# Altium schematic symbol library Minh_Lib.SchLib: 619 symbols (part 3 of 4) (continued)
## EEE-1HA330UP (continued)
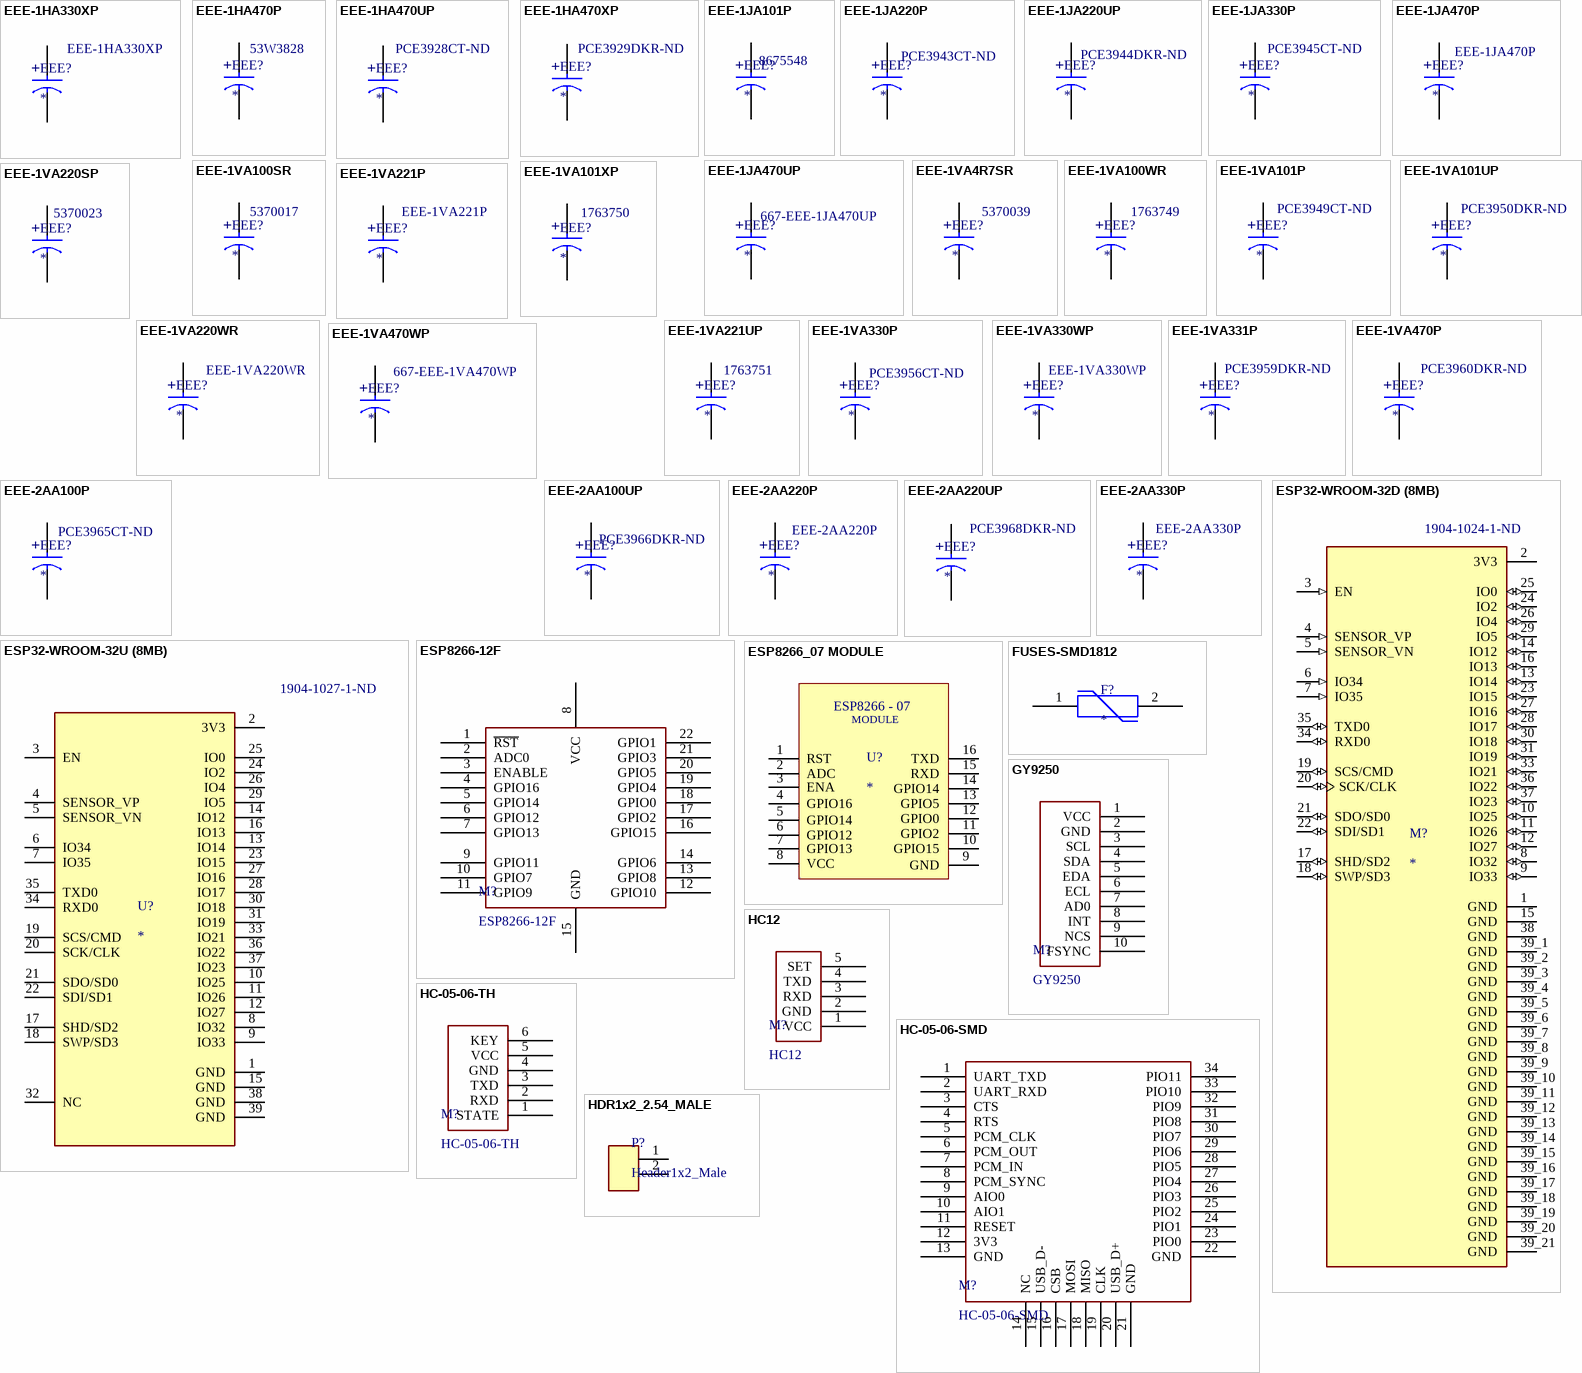
[diagram p9: symbols EEE-1HA330XP to HDR1x2_2.54_MALE]
text: +

## EEE-1HA330XP
designator EEE?  Supplier Part Number 1: EEE-1HA330XP
Cap Aluminum 33uF 50V 20% (6.3 X 7.7mm) SMD 85mA 2000 hr 85°C T/R; Manufacturer: Panasonic; Polarity: Polar; Life (Hours): 2000Hour; Leakage Current: 3uA; Lead Diameter: 0.65mm; Supplier 1: Arrow Electronics; Manufacturer Part Number: EEE-1HA330XP; RoHS: Yes; Category: Aluminum Electrolytic Capacitors; Stock 1: 7; Pricing 1: 1=0.47550 (USD); Mount: Surface Mount,PCB; Case/Package: Radial; Number of Pins: 8; Contact Plating: Tin; Min Operating Temperature: -40°C; Max Operating Temperature: 85°C; Capacitance: 33uF; Voltage Rating: 50V; Tolerance: 20%; Ripple Current: 85mA; Packaging: Tape and Reel; Package Quantity: 900; Voltage Rating (DC): 50V; Ripple Current (AC): 85mA; Termination: SMD/SMT; Voltage: 50V; Series: Automotive, AEC-Q200, S; Construction: Cylindrical; Diameter: 6.3mm; Length: 8mm; Height: 7.7mm; Height - Seated (Max): 0.303inch; Lead Pitch: 1.8mm; Radiation Hardening: No; REACH SVHC: No SVHC; Lead Free: Lead Free; RoHS Compliant: Yes; ComponentLink1URL: https://datasheet.ciiva.com/46374/aba0000ce2-46374377.pdf?src-supplier=Element14; ComponentLink1Description: https://datasheet.ciiva.com/46374/aba0000ce2-46374377.pdf?src-supplier=Element14; ComponentLink2URL: https://datasheet.ciiva.com/14604/70255710-14604844.pdf?src-supplier=Allied+Electronics; ComponentLink2Description: https://datasheet.ciiva.com/14604/70255710-14604844.pdf?src-supplier=Allied+Electronics; ComponentLink3URL: https://datasheet.ciiva.com/2985/aba0000ce2-2985169.pdf?src-supplier=Avnet; ComponentLink3Description: https://datasheet.ciiva.com/2985/aba0000ce2-2985169.pdf?src-supplier=Avnet; ComponentLink4URL: https://datasheet.ciiva.com/31414/aba0000ce2-31414680.pdf?src-supplier=Farnell; ComponentLink4Description: https://datasheet.ciiva.com/31414/aba0000ce2-31414680.pdf?src-supplier=Farnell; ComponentLink5URL: https://datasheet.ciiva.com/24240/aba0000ce2-40801-24240281.pdf?src-supplier=Mouser; ComponentLink5Description: https://datasheet.ciiva.com/24240/aba0000ce2-40801-24240281.pdf?src-supplier=Mouser; ComponentLink6URL: https://datasheet.ciiva.com/17535/aba0000ce2-17535918.pdf?src-supplier=Avnet+Europe; ComponentLink6Description: https://datasheet.ciiva.com/17535/aba0000ce2-17535918.pdf?src-supplier=Avnet+Europe
footprint CAPACITOR/ALU - SIZE D8/SMD - 6.3X7.7 (CAPACITOR  -  ALUMINIUM - SIZE D8 / EEEFK - SMD)
pins: 1, 2
text: +

## EEE-1HA470P
designator EEE?  Supplier Part Number 1: 53W3828
Cap Aluminum 47uF 50V 20% (10 X 10.2mm) SMD 130mA 2000 hr 85°C T/R; Manufacturer: Panasonic; Manufacturer Part Number: EEE-1HA470P; Life (Hours): 2000Hour; Leakage Current: 3uA; Supplier 1: Newark; RoHS: Yes; Category: Aluminum Electrolytic Capacitors; Stock 1: 2; Pricing 1: 1=0.05500, 10=0.05500, 25=0.05500, 50=0.05500, 100=0.05500 (USD); Mount: Surface Mount,PCB; Case/Package: Radial; Contact Plating: Tin; Min Operating Temperature: -40°C; Max Operating Temperature: 85°C; Capacitance: 47uF; Tolerance: 20%; Voltage Rating (DC): 50V; Packaging: Tape and Reel; Ripple Current: 130mA; Voltage Rating: 50V; Ripple Current (AC): 130mA; Package Quantity: 1; Termination: SMD/SMT; Voltage: 50V; Series: S; Construction: Cylindrical; Diameter: 10mm; Length: 10.5mm; Height: 10.2mm; Height - Seated (Max): 0.402inch; Radiation Hardening: No; REACH SVHC: No SVHC; Lead Free: Lead Free; RoHS Compliant: Yes; ComponentLink1URL: https://datasheet.ciiva.com/31414/aba0000ce2-31414681.pdf?src-supplier=Farnell; ComponentLink1Description: https://datasheet.ciiva.com/31414/aba0000ce2-31414681.pdf?src-supplier=Farnell; ComponentLink2URL: https://datasheet.ciiva.com/46374/aba0000ce2-46374376.pdf?src-supplier=Element14; ComponentLink2Description: https://datasheet.ciiva.com/46374/aba0000ce2-46374376.pdf?src-supplier=Element14; ComponentLink3URL: https://datasheet.ciiva.com/24025/aba0000ce2-40801-24025181.pdf?src-supplier=Mouser; ComponentLink3Description: https://datasheet.ciiva.com/24025/aba0000ce2-40801-24025181.pdf?src-supplier=Mouser; ComponentLink4URL: https://datasheet.ciiva.com/14604/70255710-14604759.pdf?src-supplier=Allied+Electronics; ComponentLink4Description: https://datasheet.ciiva.com/14604/70255710-14604759.pdf?src-supplier=Allied+Electronics; ComponentLink5URL: https://datasheet.ciiva.com/2985/aba0000ce2-2985173.pdf?src-supplier=Avnet; ComponentLink5Description: https://datasheet.ciiva.com/2985/aba0000ce2-2985173.pdf?src-supplier=Avnet; ComponentLink6URL: https://datasheet.ciiva.com/30243/11aba0000ce2-30243333.pdf?src-supplier=Onlinecomponents.com; ComponentLink6Description: https://datasheet.ciiva.com/30243/11aba0000ce2-30243333.pdf?src-supplier=Onlinecomponents.com; ComponentLink7URL: https://datasheet.ciiva.com/17535/aba0000ce2-17535544.pdf?src-supplier=Avnet+Europe; ComponentLink7Description: https://datasheet.ciiva.com/17535/aba0000ce2-17535544.pdf?src-supplier=Avnet+Europe
footprint CAPACITOR/ALU - SIZE G/SMD - 10X10.2 (CAPACITOR  -  ALUMINIUM - SIZE G / EEEFK - SMD)
pins: 1, 2
text: +

## EEE-1HA470UP
designator EEE?  Supplier Part Number 1: PCE3928CT-ND
Cap Aluminum 47uF 50V 20% (8 X 10.2mm) SMD 110mA 2000h 85°C T/R; Manufacturer: Panasonic; Manufacturer Part Number: EEE-1HA470UP; Life (Hours): 2000Hour; Leakage Current: 3uA; Supplier 1: Digi-Key; RoHS: Yes; Category: Aluminum Electrolytic Capacitors; Stock 1: 2; Pricing 1: 1=0.65000, 10=0.46000, 50=0.34760, 100=0.30270 (USD); Mount: Surface Mount,PCB; Case/Package: Radial; Contact Plating: Tin; Min Operating Temperature: -40°C; Max Operating Temperature: 85°C; Capacitance: 47uF; Packaging: Tape and Reel; Ripple Current: 110mA; Tolerance: 20%; Voltage Rating (DC): 50V; Voltage Rating: 50V; Package Quantity: 1; Termination: SMD/SMT; Ripple Current (AC): 110mA; Voltage: 50V; Series: S; Construction: Cylindrical; Diameter: 8mm; Length: 10.5mm; Height: 10.2mm; Height - Seated (Max): 0.402inch; Radiation Hardening: No; Lead Free: Lead Free; RoHS Compliant: Yes; REACH SVHC: No SVHC; ComponentLink1URL: https://datasheet.ciiva.com/31414/aba0000ce2-31414682.pdf?src-supplier=Farnell; ComponentLink1Description: https://datasheet.ciiva.com/31414/aba0000ce2-31414682.pdf?src-supplier=Farnell; ComponentLink2URL: https://datasheet.ciiva.com/46374/aba0000ce2-46374375.pdf?src-supplier=Element14; ComponentLink2Description: https://datasheet.ciiva.com/46374/aba0000ce2-46374375.pdf?src-supplier=Element14; ComponentLink3URL: https://datasheet.ciiva.com/24024/aba0000ce2-40801-24024618.pdf?src-supplier=Mouser; ComponentLink3Description: https://datasheet.ciiva.com/24024/aba0000ce2-40801-24024618.pdf?src-supplier=Mouser; ComponentLink4URL: https://datasheet.ciiva.com/14598/70255710-14598951.pdf?src-supplier=Allied+Electronics; ComponentLink4Description: https://datasheet.ciiva.com/14598/70255710-14598951.pdf?src-supplier=Allied+Electronics; ComponentLink5URL: https://datasheet.ciiva.com/11675/aba0000ce2-11675781.pdf?src-supplier=Avnet; ComponentLink5Description: https://datasheet.ciiva.com/11675/aba0000ce2-11675781.pdf?src-supplier=Avnet; ComponentLink6URL: https://datasheet.ciiva.com/30083/11aba0000ce2-30083149.pdf?src-supplier=Onlinecomponents.com; ComponentLink6Description: https://datasheet.ciiva.com/30083/11aba0000ce2-30083149.pdf?src-supplier=Onlinecomponents.com; ComponentLink7URL: https://datasheet.ciiva.com/17535/aba0000ce2-17535669.pdf?src-supplier=Avnet+Europe; ComponentLink7Description: https://datasheet.ciiva.com/17535/aba0000ce2-17535669.pdf?src-supplier=Avnet+Europe
footprint CAPACITOR/ALU - SIZE F/SMD - 8X10.2 (CAPACITOR  -  ALUMINIUM - SIZE F / EEEFK - SMD)
pins: 1, 2
text: +

## EEE-1HA470XP
designator EEE?  Supplier Part Number 1: PCE3929DKR-ND
Cap Aluminum Lytic 47uF 50V 20% (6.3 X 7.7mm) SMD 105mA 2000h 85C Automotive T/R; Manufacturer: Panasonic; Manufacturer Part Number: EEE-1HA470XP; Polarity: Polar; Life (Hours): 2000Hour; Leakage Current: 3uA; Supplier 1: Digi-Key; RoHS: Yes; Category: Aluminum Electrolytic Capacitors; Pricing 1: 1=0.52000, 10=0.36100, 50=0.25240, 100=0.21630 (USD); Mount: Surface Mount,PCB; Case/Package: Radial; Number of Pins: 8; Contact Plating: Tin; Min Operating Temperature: -40°C; Max Operating Temperature: 85°C; Capacitance: 47uF; Tolerance: 20%; Voltage Rating: 50V; Packaging: Tape and Reel; Ripple Current (AC): 105mA; Ripple Current: 105mA; Package Quantity: 900; Voltage Rating (DC): 50V; Termination: SMD/SMT; Voltage: 50V; Series: S; Construction: Cylindrical; Diameter: 6.3mm; Length: 8mm; Height: 7.7mm; Height - Seated (Max): 0.303inch; Radiation Hardening: No; REACH SVHC: No SVHC; Lead Free: Lead Free; RoHS Compliant: Yes; ComponentLink1URL: https://datasheet.ciiva.com/31414/aba0000ce2-31414683.pdf?src-supplier=Farnell; ComponentLink1Description: https://datasheet.ciiva.com/31414/aba0000ce2-31414683.pdf?src-supplier=Farnell; ComponentLink2URL: https://datasheet.ciiva.com/46374/aba0000ce2-46374374.pdf?src-supplier=Element14; ComponentLink2Description: https://datasheet.ciiva.com/46374/aba0000ce2-46374374.pdf?src-supplier=Element14; ComponentLink3URL: https://datasheet.ciiva.com/24068/aba0000ce2-40801-24068168.pdf?src-supplier=Mouser; ComponentLink3Description: https://datasheet.ciiva.com/24068/aba0000ce2-40801-24068168.pdf?src-supplier=Mouser; ComponentLink4URL: https://datasheet.ciiva.com/2983/aba0000ce2-2983922.pdf?src-supplier=Avnet; ComponentLink4Description: https://datasheet.ciiva.com/2983/aba0000ce2-2983922.pdf?src-supplier=Avnet; ComponentLink5URL: https://datasheet.ciiva.com/16427/aba0000ce2-16427545.pdf?src-supplier=Future+Electronics; ComponentLink5Description: https://datasheet.ciiva.com/16427/aba0000ce2-16427545.pdf?src-supplier=Future+Electronics; ComponentLink6URL: https://datasheet.ciiva.com/15166/getdatasheetpartid-212318-15166389.pdf?src-supplier=Verical; ComponentLink6Description: https://datasheet.ciiva.com/15166/getdatasheetpartid-212318-15166389.pdf?src-supplier=Verical; ComponentLink7URL: https://datasheet.ciiva.com/30111/11aba0000ce2-30111849.pdf?src-supplier=Onlinecomponents.com; ComponentLink7Description: https://datasheet.ciiva.com/30111/11aba0000ce2-30111849.pdf?src-supplier=Onlinecomponents.com; ComponentLink8URL: https://datasheet.ciiva.com/17535/aba0000ce2-17535692.pdf?src-supplier=Avnet+Europe; ComponentLink8Description: https://datasheet.ciiva.com/17535/aba0000ce2-17535692.pdf?src-supplier=Avnet+Europe
footprint CAPACITOR/ALU - SIZE D8/SMD - 6.3X7.7 (CAPACITOR  -  ALUMINIUM - SIZE D8 / EEEFK - SMD)
pins: 1, 2
text: +

## EEE-1JA101P
designator EEE?  Supplier Part Number 1: 8675548
Cap Aluminum 100uF 63V 20% (10 X 10.2mm) SMD 60mA 2000h 85°C T/R; Manufacturer: Panasonic; Manufacturer Part Number: EEE-1JA101P; Dielectric Material: Aluminium; Polarity: Polar; Life (Hours): 2000Hour; Leakage Current: 63uA; Supplier 1: RSComponents; RoHS: Yes; Category: Aluminum Electrolytic Capacitors; Stock 1: 55; Pricing 1: 5=0.71500, 25=0.49300, 50=0.38800, 250=0.25200, 500=0.23000, 5=0.51600, 25=0.35600, 50=0.28000, 250=0.18200, 500=0.16600 (USD); Mount: Surface Mount,PCB; Case/Package: Radial; Contact Plating: Tin; Min Operating Temperature: -40°C; Max Operating Temperature: 85°C; Capacitance: 100uF; Voltage Rating: 63V; Tolerance: 20%; Ripple Current: 60mA; Packaging: Tape and Reel; Package Quantity: 1; Voltage Rating (DC): 63V; Termination: SMD/SMT; Ripple Current (AC): 60mA; Voltage: 63V; Series: S; Construction: Cylindrical; Diameter: 10mm; Length: 10.5mm; Height: 10.2mm; Height - Seated (Max): 0.402inch; Radiation Hardening: No; Lead Free: Lead Free; REACH SVHC: Unknown; RoHS Compliant: Yes; ComponentLink1URL: https://datasheet.ciiva.com/43470/aba0000ce2-43470679.pdf?src-supplier=Farnell; ComponentLink1Description: https://datasheet.ciiva.com/43470/aba0000ce2-43470679.pdf?src-supplier=Farnell; ComponentLink2URL: https://datasheet.ciiva.com/31414/aba0000ce2-31414687.pdf?src-supplier=Farnell; ComponentLink2Description: https://datasheet.ciiva.com/31414/aba0000ce2-31414687.pdf?src-supplier=Farnell; ComponentLink3URL: https://datasheet.ciiva.com/24068/aba0000ce2-40801-24068778.pdf?src-supplier=Mouser; ComponentLink3Description: https://datasheet.ciiva.com/24068/aba0000ce2-40801-24068778.pdf?src-supplier=Mouser; ComponentLink4URL: https://datasheet.ciiva.com/14604/70255710-14604807.pdf?src-supplier=Allied+Electronics; ComponentLink4Description: https://datasheet.ciiva.com/14604/70255710-14604807.pdf?src-supplier=Allied+Electronics; ComponentLink5URL: https://datasheet.ciiva.com/14603/70255710-14603749.pdf?src-supplier=Allied+Electronics; ComponentLink5Description: https://datasheet.ciiva.com/14603/70255710-14603749.pdf?src-supplier=Allied+Electronics; ComponentLink6URL: https://datasheet.ciiva.com/10330/aba0000ce2-10330988.pdf?src-supplier=Avnet; ComponentLink6Description: https://datasheet.ciiva.com/10330/aba0000ce2-10330988.pdf?src-supplier=Avnet; ComponentLink7URL: https://datasheet.ciiva.com/16425/aba0000ce2-16425818.pdf?src-supplier=Future+Electronics; ComponentLink7Description: https://datasheet.ciiva.com/16425/aba0000ce2-16425818.pdf?src-supplier=Future+Electronics; ComponentLink8URL: https://datasheet.ciiva.com/2983/aba0000ce2-2983923.pdf?src-supplier=Avnet; ComponentLink8Description: https://datasheet.ciiva.com/2983/aba0000ce2-2983923.pdf?src-supplier=Avnet; ComponentLink9URL: https://datasheet.ciiva.com/30193/11aba0000ce2-30193446.pdf?src-supplier=Onlinecomponents.com; ComponentLink9Description: https://datasheet.ciiva.com/30193/11aba0000ce2-30193446.pdf?src-supplier=Onlinecomponents.com
footprint CAPACITOR/ALU - SIZE G/SMD - 10X10.2 (CAPACITOR  -  ALUMINIUM - SIZE G / EEEFK - SMD)
pins: 1, 2
text: +

## EEE-1JA220P
designator EEE?  Supplier Part Number 1: PCE3943CT-ND
Cap Aluminum 22uF 63V 20% (8 X 10.2mm) SMD 40mA 2000 hr 85°C T/R; Manufacturer: Panasonic; Manufacturer Part Number: EEE-1JA220P; Leakage Current: 3uA; Polarity: Polar; Life (Hours): 2000Hour; Dissipation Factor: 0.18%; Supplier 1: Digi-Key; RoHS: Yes; Category: Aluminum Electrolytic Capacitors; Pricing 1: 1=0.72000, 10=0.50600, 50=0.38260, 100=0.33320 (USD); Mount: Surface Mount; Case/Package: Radial; Min Operating Temperature: -40°C; Max Operating Temperature: 85°C; Capacitance: 22uF; Tolerance: 20%; Ripple Current: 40mA; Packaging: Tape and Reel; Voltage Rating: 63V; Voltage Rating (DC): 63V; Package Quantity: 500; Ripple Current (AC): 40mA; Termination: SMD/SMT; Voltage: 63V; Series: Automotive, AEC-Q200, S; Construction: Cylindrical; Diameter: 8mm; Length: 10.2mm; Height: 10.2mm; Height - Seated (Max): 0.402inch; Radiation Hardening: No; REACH SVHC: Unknown; Lead Free: Lead Free; RoHS Compliant: Yes; ComponentLink1URL: https://datasheet.ciiva.com/30246/11aba0000ce2-30246389.pdf?src-supplier=Onlinecomponents.com; ComponentLink1Description: https://datasheet.ciiva.com/30246/11aba0000ce2-30246389.pdf?src-supplier=Onlinecomponents.com; ComponentLink2URL: https://datasheet.ciiva.com/17536/aba0000ce2-17536519.pdf?src-supplier=Avnet+Europe; ComponentLink2Description: https://datasheet.ciiva.com/17536/aba0000ce2-17536519.pdf?src-supplier=Avnet+Europe; ComponentLink3URL: https://datasheet.ciiva.com/43470/aba0000ce2-43470680.pdf?src-supplier=Farnell; ComponentLink3Description: https://datasheet.ciiva.com/43470/aba0000ce2-43470680.pdf?src-supplier=Farnell; ComponentLink4URL: https://datasheet.ciiva.com/14599/70255710-14599001.pdf?src-supplier=Allied+Electronics; ComponentLink4Description: https://datasheet.ciiva.com/14599/70255710-14599001.pdf?src-supplier=Allied+Electronics; ComponentLink5URL: https://datasheet.ciiva.com/14607/70255710-14607413.pdf?src-supplier=Allied+Electronics; ComponentLink5Description: https://datasheet.ciiva.com/14607/70255710-14607413.pdf?src-supplier=Allied+Electronics; ComponentLink6URL: https://datasheet.ciiva.com/10330/aba0000ce2-10330989.pdf?src-supplier=Avnet; ComponentLink6Description: https://datasheet.ciiva.com/10330/aba0000ce2-10330989.pdf?src-supplier=Avnet; ComponentLink7URL: https://datasheet.ciiva.com/46378/aba0000ce2-46378349.pdf?src-supplier=Element14; ComponentLink7Description: https://datasheet.ciiva.com/46378/aba0000ce2-46378349.pdf?src-supplier=Element14; ComponentLink8URL: https://datasheet.ciiva.com/2985/aba0000ce2-2985199.pdf?src-supplier=Avnet; ComponentLink8Description: https://datasheet.ciiva.com/2985/aba0000ce2-2985199.pdf?src-supplier=Avnet
footprint CAPACITOR/ALU - SIZE F/SMD - 8X10.2 (CAPACITOR  -  ALUMINIUM - SIZE F / EEEFK - SMD)
pins: 1, 2
text: +

## EEE-1JA220UP
designator EEE?  Supplier Part Number 1: PCE3944DKR-ND
Cap Aluminum 22uF 63V 20% (8 X 6.2mm) SMD 40mA 2000h 85°C T/R; Manufacturer: Panasonic; Manufacturer Part Number: EEE-1JA220UP; Life (Hours): 2000Hour; Leakage Current: 3uA; Supplier 1: Digi-Key; RoHS: Yes; Category: Aluminum Electrolytic Capacitors; Pricing 1: 1=0.56000, 10=0.39400, 50=0.29760, 100=0.25930, 500=0.19204 (USD); Mount: Surface Mount,PCB; Case/Package: Radial; Contact Plating: Tin; Min Operating Temperature: -40°C; Max Operating Temperature: 85°C; Capacitance: 22uF; Voltage Rating: 63V; Tolerance: 20%; Ripple Current: 40mA; Packaging: Tape and Reel; Package Quantity: 1; Ripple Current (AC): 40mA; Voltage Rating (DC): 63V; Termination: SMD/SMT; Voltage: 63V; Features: General Purpose; Series: S; Construction: Cylindrical; Diameter: 8mm; Length: 6.5mm; Height: 6.2mm; Height - Seated (Max): 0.244inch; Radiation Hardening: No; REACH SVHC: No SVHC; Lead Free: Lead Free; RoHS Compliant: Yes; ComponentLink1URL: https://datasheet.ciiva.com/43470/aba0000ce2-43470681.pdf?src-supplier=Farnell; ComponentLink1Description: https://datasheet.ciiva.com/43470/aba0000ce2-43470681.pdf?src-supplier=Farnell; ComponentLink2URL: https://datasheet.ciiva.com/46378/aba0000ce2-46378348.pdf?src-supplier=Element14; ComponentLink2Description: https://datasheet.ciiva.com/46378/aba0000ce2-46378348.pdf?src-supplier=Element14; ComponentLink3URL: https://datasheet.ciiva.com/14596/70255710-14596587.pdf?src-supplier=Allied+Electronics; ComponentLink3Description: https://datasheet.ciiva.com/14596/70255710-14596587.pdf?src-supplier=Allied+Electronics; ComponentLink4URL: https://datasheet.ciiva.com/2985/aba0000ce2-2985200.pdf?src-supplier=Avnet; ComponentLink4Description: https://datasheet.ciiva.com/2985/aba0000ce2-2985200.pdf?src-supplier=Avnet; ComponentLink5URL: https://datasheet.ciiva.com/16223/aba0000ce2-16223704.pdf?src-supplier=Future+Electronics; ComponentLink5Description: https://datasheet.ciiva.com/16223/aba0000ce2-16223704.pdf?src-supplier=Future+Electronics; ComponentLink6URL: https://datasheet.ciiva.com/30111/11aba0000ce2-30111469.pdf?src-supplier=Onlinecomponents.com; ComponentLink6Description: https://datasheet.ciiva.com/30111/11aba0000ce2-30111469.pdf?src-supplier=Onlinecomponents.com; ComponentLink7URL: https://datasheet.ciiva.com/17536/aba0000ce2-17536522.pdf?src-supplier=Avnet+Europe; ComponentLink7Description: https://datasheet.ciiva.com/17536/aba0000ce2-17536522.pdf?src-supplier=Avnet+Europe
footprint CAPACITOR/ALU - SIZE E/SMD - 8X6.2 (CAPACITOR  -  ALUMINIUM - SIZE E / EEEFK - SMD)
pins: 1, 2
text: +

## EEE-1JA330P
designator EEE?  Supplier Part Number 1: PCE3945CT-ND
Cap Aluminum 33uF 63V 20% (8 X 10.2mm) SMD 45mA 2000h 85°C T/R; Manufacturer: Panasonic; Manufacturer Part Number: EEE-1JA330P; Life (Hours): 2000Hour; Polarity: Polar; Leakage Current: 3uA; Supplier 1: Digi-Key; RoHS: Yes; Category: Aluminum Electrolytic Capacitors; Pricing 1: 1=0.72000, 10=0.50600, 50=0.38260, 100=0.33320 (USD); Mount: Surface Mount; Case/Package: Radial; Min Operating Temperature: -40°C; Max Operating Temperature: 85°C; Packaging: Tape and Reel; Capacitance: 33uF; Tolerance: 20%; Ripple Current: 45mA; Voltage Rating: 63V; Voltage Rating (DC): 63V; Package Quantity: 500; Termination: SMD/SMT; Voltage: 63V; Series: Automotive, AEC-Q200, S; Construction: Cylindrical; Diameter: 8mm; Length: 10.5mm; Height: 10.2mm; Height - Seated (Max): 0.402inch; Radiation Hardening: No; Lead Free: Lead Free; RoHS Compliant: Yes; ComponentLink1URL: https://datasheet.ciiva.com/17536/aba0000ce2-17536453.pdf?src-supplier=Avnet+Europe; ComponentLink1Description: https://datasheet.ciiva.com/17536/aba0000ce2-17536453.pdf?src-supplier=Avnet+Europe; ComponentLink2URL: https://datasheet.ciiva.com/2985/aba0000ce2-2985201.pdf?src-supplier=Avnet; ComponentLink2Description: https://datasheet.ciiva.com/2985/aba0000ce2-2985201.pdf?src-supplier=Avnet; ComponentLink3URL: https://datasheet.ciiva.com/2985/aba0000ce2-2985202.pdf?src-supplier=Avnet; ComponentLink3Description: https://datasheet.ciiva.com/2985/aba0000ce2-2985202.pdf?src-supplier=Avnet; ComponentLink4URL: https://datasheet.ciiva.com/14601/70255710-14601079.pdf?src-supplier=Allied+Electronics; ComponentLink4Description: https://datasheet.ciiva.com/14601/70255710-14601079.pdf?src-supplier=Allied+Electronics
footprint CAPACITOR/ALU - SIZE F/SMD - 8X10.2 (CAPACITOR  -  ALUMINIUM - SIZE F / EEEFK - SMD)
pins: 1, 2
text: +

## EEE-1JA470P
designator EEE?  Supplier Part Number 1: EEE-1JA470P
S (V) Series 63 V 47 uF 85°C 2 kHrs SMT Aluminum Electrolytic Capacitor; Manufacturer: Panasonic; Capacitance: 47uF; Tolerance: 20%; Ripple Current: 45mA; Voltage Rating: 63V; Life (Hours): 2000Hour; Leakage Current: 3uA; Polarity: Polar; Dissipation Factor: 0.18%; Supplier 1: Arrow Electronics; Manufacturer Part Number: EEE-1JA470P; RoHS: Yes; Category: Aluminum Electrolytic Capacitors; Stock 1: 21; Pricing 1: 1=0.67960, 10=0.42020 (USD); Mount: Surface Mount; Case/Package: Radial; Min Operating Temperature: -40°C; Max Operating Temperature: 85°C; Packaging: Tape and Reel; Voltage Rating (DC): 63V; Package Quantity: 500; Termination: SMD/SMT; Series: S; Construction: Cylindrical; Diameter: 10mm; Length: 10.2mm; Height: 12mm; Height - Seated (Max): 0.413inch; Ratings: AEC-Q200; Radiation Hardening: No; RoHS Compliant: Yes; ComponentLink1URL: https://datasheet.ciiva.com/24229/aba0000ce2-40801-24229064.pdf?src-supplier=Mouser; ComponentLink1Description: https://datasheet.ciiva.com/24229/aba0000ce2-40801-24229064.pdf?src-supplier=Mouser; ComponentLink2URL: https://datasheet.ciiva.com/11680/aba0000ce2-11680934.pdf?src-supplier=Avnet; ComponentLink2Description: https://datasheet.ciiva.com/11680/aba0000ce2-11680934.pdf?src-supplier=Avnet; ComponentLink3URL: https://datasheet.ciiva.com/17536/aba0000ce2-17536455.pdf?src-supplier=Avnet+Europe; ComponentLink3Description: https://datasheet.ciiva.com/17536/aba0000ce2-17536455.pdf?src-supplier=Avnet+Europe
footprint CAPACITOR/ALU - SIZE G/SMD - 10X10.2 (CAPACITOR  -  ALUMINIUM - SIZE G / EEEFK - SMD)
pins: 1, 2
text: +

## EEE-1JA470UP
designator EEE?  Supplier Part Number 1: 667-EEE-1JA470UP
Cap Aluminum 47uF 63V 20% (8 X 10.2mm) SMD 45mA 2000h 85 C T/R; Manufacturer: Panasonic; Manufacturer Part Number: EEE-1JA470UP; Polarity: Polar; Life (Hours): 2000Hour; Leakage Current: 3uA; Supplier 1: Mouser; RoHS: Yes; Category: Aluminum Electrolytic Capacitors; Stock 1: 1; Pricing 1: 1=0.71000, 10=0.50600, 50=0.50600, 100=0.33400, 1000=0.24600, 10000=0.24600 (USD); Mount: Surface Mount,PCB; Case/Package: Radial; Contact Plating: Tin; Min Operating Temperature: -40°C; Max Operating Temperature: 85°C; Capacitance: 47uF; Voltage Rating: 63V; Tolerance: 20%; Ripple Current: 45mA; Packaging: Tape and Reel; Package Quantity: 500; Voltage Rating (DC): 63V; Termination: SMD/SMT; Voltage: 63V; Ripple Current (AC): 45mA; Series: S; Construction: Cylindrical; Diameter: 8mm; Length: 10.5mm; Height: 10.2mm; Height - Seated (Max): 0.402inch; Radiation Hardening: No; Lead Free: Lead Free; RoHS Compliant: Yes; REACH SVHC: No SVHC; ComponentLink1URL: https://datasheet.ciiva.com/43470/aba0000ce2-43470682.pdf?src-supplier=Farnell; ComponentLink1Description: https://datasheet.ciiva.com/43470/aba0000ce2-43470682.pdf?src-supplier=Farnell; ComponentLink2URL: https://datasheet.ciiva.com/46378/aba0000ce2-46378347.pdf?src-supplier=Element14; ComponentLink2Description: https://datasheet.ciiva.com/46378/aba0000ce2-46378347.pdf?src-supplier=Element14; ComponentLink3URL: https://datasheet.ciiva.com/46374/aba0000ce2-46374367.pdf?src-supplier=Element14; ComponentLink3Description: https://datasheet.ciiva.com/46374/aba0000ce2-46374367.pdf?src-supplier=Element14; ComponentLink4URL: https://datasheet.ciiva.com/24024/aba0000ce2-40801-24024439.pdf?src-supplier=Mouser; ComponentLink4Description: https://datasheet.ciiva.com/24024/aba0000ce2-40801-24024439.pdf?src-supplier=Mouser; ComponentLink5URL: https://datasheet.ciiva.com/14608/70255710-14608888.pdf?src-supplier=Allied+Electronics; ComponentLink5Description: https://datasheet.ciiva.com/14608/70255710-14608888.pdf?src-supplier=Allied+Electronics; ComponentLink6URL: https://datasheet.ciiva.com/14604/70255710-14604536.pdf?src-supplier=Allied+Electronics; ComponentLink6Description: https://datasheet.ciiva.com/14604/70255710-14604536.pdf?src-supplier=Allied+Electronics; ComponentLink7URL: https://datasheet.ciiva.com/11680/aba0000ce2-11680935.pdf?src-supplier=Avnet; ComponentLink7Description: https://datasheet.ciiva.com/11680/aba0000ce2-11680935.pdf?src-supplier=Avnet; ComponentLink8URL: https://datasheet.ciiva.com/2985/aba0000ce2-2985203.pdf?src-supplier=Avnet; ComponentLink8Description: https://datasheet.ciiva.com/2985/aba0000ce2-2985203.pdf?src-supplier=Avnet; ComponentLink9URL: https://datasheet.ciiva.com/30218/11aba0000ce2-30218299.pdf?src-supplier=Onlinecomponents.com; ComponentLink9Description: https://datasheet.ciiva.com/30218/11aba0000ce2-30218299.pdf?src-supplier=Onlinecomponents.com; ComponentLink10URL: https://datasheet.ciiva.com/17536/aba0000ce2-17536457.pdf?src-supplier=Avnet+Europe; ComponentLink10Description: https://datasheet.ciiva.com/17536/aba0000ce2-17536457.pdf?src-supplier=Avnet+Europe
footprint CAPACITOR/ALU - SIZE F/SMD - 8X10.2 (CAPACITOR  -  ALUMINIUM - SIZE F / EEEFK - SMD)
pins: 1, 2
text: +

## EEE-1VA4R7SR
designator EEE?  Supplier Part Number 1: 5370039
Cap Aluminum 4.7uF 35V 20% (4 X 5.4mm) SMD 22mA 2000h 85°C T/R; Manufacturer: Panasonic; Manufacturer Part Number: EEE-1VA4R7SR; Dielectric Material: Aluminium; Polarity: Polar; Life (Hours): 2000Hour; Leakage Current: 3uA; Lead Length: 1.8mm; Supplier 1: RSComponents; RoHS: Yes; Category: Aluminum Electrolytic Capacitors; Stock 1: 820; Pricing 1: 5=0.22200, 25=0.15800, 375=0.08900, 1250=0.06100, 1500=0.05800, 5=0.16000, 25=0.11400, 375=0.06400, 1250=0.04400, 1500=0.04200 (USD); Mount: Surface Mount,PCB; Case/Package: Radial; Number of Pins: 2; Contact Plating: Tin; Min Operating Temperature: -40°C; Max Operating Temperature: 85°C; Capacitance: 4.7uF; Voltage Rating: 35V; Tolerance: 20%; Ripple Current: 22mA; Packaging: Tape and Reel; Package Quantity: 2000; Voltage Rating (DC): 35V; Termination: SMD/SMT; Series: S; Construction: Cylindrical; Ripple Current (AC): 22mA; Voltage: 35V; Diameter: 4mm; Length: 5.5mm; Width: 4.3mm; Height: 5.4mm; Height - Seated (Max): 0.213inch; Lead Pitch: 1mm; Radiation Hardening: No; RoHS Compliant: Yes; REACH SVHC: No SVHC; Lead Free: Lead Free; ComponentLink1URL: https://datasheet.ciiva.com/11778/0900766b8078636e-11778079.pdf?src-supplier=RSComponents; ComponentLink1Description: https://datasheet.ciiva.com/11778/0900766b8078636e-11778079.pdf?src-supplier=RSComponents; ComponentLink2URL: https://datasheet.ciiva.com/28692/aba0000ce2-28692603.pdf?src-supplier=Element14; ComponentLink2Description: https://datasheet.ciiva.com/28692/aba0000ce2-28692603.pdf?src-supplier=Element14; ComponentLink3URL: https://datasheet.ciiva.com/24070/aba0000ce2-40801-24070876.pdf?src-supplier=Mouser; ComponentLink3Description: https://datasheet.ciiva.com/24070/aba0000ce2-40801-24070876.pdf?src-supplier=Mouser; ComponentLink4URL: https://datasheet.ciiva.com/14596/70255710-14596106.pdf?src-supplier=Allied+Electronics; ComponentLink4Description: https://datasheet.ciiva.com/14596/70255710-14596106.pdf?src-supplier=Allied+Electronics; ComponentLink5URL: https://datasheet.ciiva.com/43485/aba0000ce2-43485615.pdf?src-supplier=Farnell; ComponentLink5Description: https://datasheet.ciiva.com/43485/aba0000ce2-43485615.pdf?src-supplier=Farnell; ComponentLink6URL: https://datasheet.ciiva.com/46388/aba0000ce2-46388255.pdf?src-supplier=Element14; ComponentLink6Description: https://datasheet.ciiva.com/46388/aba0000ce2-46388255.pdf?src-supplier=Element14; ComponentLink7URL: https://datasheet.ciiva.com/6196/aba0000ce2-6196261.pdf?src-supplier=Farnell; ComponentLink7Description: https://datasheet.ciiva.com/6196/aba0000ce2-6196261.pdf?src-supplier=Farnell; ComponentLink8URL: https://datasheet.ciiva.com/46376/aba0000ce2-46376414.pdf?src-supplier=Element14; ComponentLink8Description: https://datasheet.ciiva.com/46376/aba0000ce2-46376414.pdf?src-supplier=Element14; ComponentLink9URL: https://datasheet.ciiva.com/11681/aba0000ce2-11681159.pdf?src-supplier=Avnet; ComponentLink9Description: https://datasheet.ciiva.com/11681/aba0000ce2-11681159.pdf?src-supplier=Avnet; ComponentLink10URL: https://datasheet.ciiva.com/30115/11aba0000ce2-30115685.pdf?src-supplier=Onlinecomponents.com; ComponentLink10Description: https://datasheet.ciiva.com/30115/11aba0000ce2-30115685.pdf?src-supplier=Onlinecomponents.com; ComponentLink11URL: https://datasheet.ciiva.com/15165/getdatasheetpartid-52390-15165756.pdf?src-supplier=Verical; ComponentLink11Description: https://datasheet.ciiva.com/15165/getdatasheetpartid-52390-15165756.pdf?src-supplier=Verical; ComponentLink12URL: https://datasheet.ciiva.com/17536/aba0000ce2-17536895.pdf?src-supplier=Avnet+Europe; ComponentLink12Description: https://datasheet.ciiva.com/17536/aba0000ce2-17536895.pdf?src-supplier=Avnet+Europe
footprint CAPACITOR/ALU - SIZE B/SMD - 4X5.4 (CAPACITOR  -  ALUMINIUM - SIZE B / EEEFK - SMD)
pins: 1, 2
text: +

## EEE-1VA100SR
designator EEE?  Supplier Part Number 1: 5370017
Cap Aluminum 10uF 35V 20% (5 X 5.4mm) SMD 30mA 2000h 85°C T/R; Manufacturer: Panasonic; Manufacturer Part Number: EEE-1VA100SR; Life (Hours): 2000Hour; Leakage Current: 3uA; Lead Length: 2.2mm; Supplier 1: RSComponents; RoHS: Yes; Category: Aluminum Electrolytic Capacitors; Stock 1: 1630; Pricing 1: 5=0.36800, 250=0.11400, 500=0.11100, 2500=0.10500, 5000=0.10000, 5=0.26600, 250=0.08200, 500=0.08000, 2500=0.07600, 5000=0.07200 (USD); Mount: Surface Mount,PCB; Case/Package: Radial; Number of Pins: 2; Contact Plating: Tin; Min Operating Temperature: -40°C; Max Operating Temperature: 85°C; Capacitance: 10uF; Voltage Rating: 35V; Tolerance: 20%; Ripple Current: 30mA; Packaging: Tape and Reel; Package Quantity: 1; Ripple Current (AC): 30mA; Voltage Rating (DC): 35V; Termination: SMD/SMT; Voltage: 35V; Series: S; Construction: Cylindrical; Diameter: 5mm; Length: 5.5mm; Width: 5.3mm; Height: 5.4mm; Height - Seated (Max): 0.213inch; Lead Pitch: 1.5mm; Radiation Hardening: No; REACH SVHC: No SVHC; RoHS Compliant: Yes; ComponentLink1URL: https://datasheet.ciiva.com/11779/0900766b806bc51d-11779777.pdf?src-supplier=RSComponents; ComponentLink1Description: https://datasheet.ciiva.com/11779/0900766b806bc51d-11779777.pdf?src-supplier=RSComponents; ComponentLink2URL: https://datasheet.ciiva.com/28692/aba0000ce2-28692573.pdf?src-supplier=Element14; ComponentLink2Description: https://datasheet.ciiva.com/28692/aba0000ce2-28692573.pdf?src-supplier=Element14; ComponentLink3URL: https://datasheet.ciiva.com/24025/aba0000ce2-40801-24025642.pdf?src-supplier=Mouser; ComponentLink3Description: https://datasheet.ciiva.com/24025/aba0000ce2-40801-24025642.pdf?src-supplier=Mouser; ComponentLink4URL: https://datasheet.ciiva.com/14609/70068009-14609644.pdf?src-supplier=Allied+Electronics; ComponentLink4Description: https://datasheet.ciiva.com/14609/70068009-14609644.pdf?src-supplier=Allied+Electronics; ComponentLink5URL: https://datasheet.ciiva.com/14609/70255710-14609337.pdf?src-supplier=Allied+Electronics; ComponentLink5Description: https://datasheet.ciiva.com/14609/70255710-14609337.pdf?src-supplier=Allied+Electronics; ComponentLink6URL: https://datasheet.ciiva.com/46387/aba0000ce2-46387357.pdf?src-supplier=Element14; ComponentLink6Description: https://datasheet.ciiva.com/46387/aba0000ce2-46387357.pdf?src-supplier=Element14; ComponentLink7URL: https://datasheet.ciiva.com/6121/aba0000ce2-6121385.pdf?src-supplier=Farnell; ComponentLink7Description: https://datasheet.ciiva.com/6121/aba0000ce2-6121385.pdf?src-supplier=Farnell; ComponentLink8URL: https://datasheet.ciiva.com/46376/aba0000ce2-46376358.pdf?src-supplier=Element14; ComponentLink8Description: https://datasheet.ciiva.com/46376/aba0000ce2-46376358.pdf?src-supplier=Element14; ComponentLink9URL: https://datasheet.ciiva.com/11673/aba0000ce2-11673886.pdf?src-supplier=Avnet; ComponentLink9Description: https://datasheet.ciiva.com/11673/aba0000ce2-11673886.pdf?src-supplier=Avnet; ComponentLink10URL: https://datasheet.ciiva.com/16425/aba0000ce2-16425820.pdf?src-supplier=Future+Electronics; ComponentLink10Description: https://datasheet.ciiva.com/16425/aba0000ce2-16425820.pdf?src-supplier=Future+Electronics; ComponentLink11URL: https://datasheet.ciiva.com/30116/11aba0000ce2-30116461.pdf?src-supplier=Onlinecomponents.com; ComponentLink11Description: https://datasheet.ciiva.com/30116/11aba0000ce2-30116461.pdf?src-supplier=Onlinecomponents.com
footprint CAPACITOR/ALU - SIZE C/SMD - 5X5.4 (CAPACITOR  -  ALUMINIUM - SIZE C / EEEFK - SMD)
pins: 1, 2
text: +

## EEE-1VA100WR
designator EEE?  Supplier Part Number 1: 1763749
Cap Aluminum 10uF 35V 20% (4 X 5.4mm) SMD 22mA 1000h 85 C T/R; Manufacturer: Panasonic; Manufacturer Part Number: EEE-1VA100WR; Polarity: Polar; Life (Hours): 1000Hour; Leakage Current: 3uA; Supplier 1: RSComponents; RoHS: Yes; Category: Aluminum Electrolytic Capacitors; Stock 1: 400; Pricing 1: 2000=0.06500, 6000=0.06400, 2000=0.04700, 6000=0.04600 (USD); Mount: Surface Mount,PCB; Case/Package: Radial; Contact Plating: Tin; Min Operating Temperature: -40°C; Max Operating Temperature: 85°C; Capacitance: 10uF; Voltage Rating: 35V; Tolerance: 20%; Ripple Current: 22mA; Packaging: Tape and Reel; Package Quantity: 2000; Voltage Rating (DC): 35V; Termination: SMD/SMT; Ripple Current (AC): 22mA; Voltage: 35V; Series: S; Construction: Cylindrical; Diameter: 4mm; Length: 5.5mm; Height: 5.4mm; Height - Seated (Max): 0.213inch; Size: 5.4mm; Radiation Hardening: No; Lead Free: Lead Free; RoHS Compliant: Yes; REACH SVHC: Unknown; ComponentLink1URL: https://datasheet.ciiva.com/19479/1984048-19479308.pdf?src-supplier=Jameco; ComponentLink1Description: https://datasheet.ciiva.com/19479/1984048-19479308.pdf?src-supplier=Jameco; ComponentLink2URL: https://datasheet.ciiva.com/24068/aba0000ce2-40801-24068681.pdf?src-supplier=Mouser; ComponentLink2Description: https://datasheet.ciiva.com/24068/aba0000ce2-40801-24068681.pdf?src-supplier=Mouser; ComponentLink3URL: https://datasheet.ciiva.com/2983/aba0000ce2-2983924.pdf?src-supplier=Avnet; ComponentLink3Description: https://datasheet.ciiva.com/2983/aba0000ce2-2983924.pdf?src-supplier=Avnet; ComponentLink4URL: https://datasheet.ciiva.com/16201/aba0000ce2-16201111.pdf?src-supplier=Future+Electronics; ComponentLink4Description: https://datasheet.ciiva.com/16201/aba0000ce2-16201111.pdf?src-supplier=Future+Electronics; ComponentLink5URL: https://datasheet.ciiva.com/15165/getdatasheetpartid-127958-15165979.pdf?src-supplier=Verical; ComponentLink5Description: https://datasheet.ciiva.com/15165/getdatasheetpartid-127958-15165979.pdf?src-supplier=Verical; ComponentLink6URL: https://datasheet.ciiva.com/17536/aba0000ce2-17536891.pdf?src-supplier=Avnet+Europe; ComponentLink6Description: https://datasheet.ciiva.com/17536/aba0000ce2-17536891.pdf?src-supplier=Avnet+Europe
footprint CAPACITOR/ALU - SIZE B/SMD - 4X5.4 (CAPACITOR  -  ALUMINIUM - SIZE B / EEEFK - SMD)
pins: 1, 2
text: +

## EEE-1VA101P
designator EEE?  Supplier Part Number 1: PCE3949CT-ND
Cap Aluminum 100uF 35V 20% (10 X 10.2mm) SMD 210mA 2000 hr 85°C T/R; Manufacturer: Panasonic; Manufacturer Part Number: EEE-1VA101P; Dielectric Material: Aluminium; Life (Hours): 2000Hour; Leakage Current: 35uA; Supplier 1: Digi-Key; RoHS: Yes; Category: Aluminum Electrolytic Capacitors; Pricing 1: 1=0.76000, 10=0.53800, 50=0.40720, 100=0.35460 (USD); Mount: Surface Mount,PCB; Case/Package: Radial; Contact Plating: Tin; Min Operating Temperature: -40°C; Max Operating Temperature: 85°C; Capacitance: 100uF; Voltage Rating: 35V; Ripple Current: 210mA; Packaging: Tape and Reel; Tolerance: 20%; Voltage Rating (DC): 35V; Package Quantity: 500; Ripple Current (AC): 210mA; Termination: SMD/SMT; Voltage: 35V; Series: S; Construction: Cylindrical; Diameter: 10mm; Length: 10.5mm; Height: 10.2mm; Height - Seated (Max): 0.402inch; Radiation Hardening: No; REACH SVHC: No SVHC; Lead Free: Lead Free; RoHS Compliant: Yes; ComponentLink1URL: https://datasheet.ciiva.com/43470/aba0000ce2-43470685.pdf?src-supplier=Farnell; ComponentLink1Description: https://datasheet.ciiva.com/43470/aba0000ce2-43470685.pdf?src-supplier=Farnell; ComponentLink2URL: https://datasheet.ciiva.com/46378/aba0000ce2-46378344.pdf?src-supplier=Element14; ComponentLink2Description: https://datasheet.ciiva.com/46378/aba0000ce2-46378344.pdf?src-supplier=Element14; ComponentLink3URL: https://datasheet.ciiva.com/31414/aba0000ce2-31414693.pdf?src-supplier=Farnell; ComponentLink3Description: https://datasheet.ciiva.com/31414/aba0000ce2-31414693.pdf?src-supplier=Farnell; ComponentLink4URL: https://datasheet.ciiva.com/46374/aba0000ce2-46374430.pdf?src-supplier=Element14; ComponentLink4Description: https://datasheet.ciiva.com/46374/aba0000ce2-46374430.pdf?src-supplier=Element14; ComponentLink5URL: https://datasheet.ciiva.com/24068/aba0000ce2-40801-24068696.pdf?src-supplier=Mouser; ComponentLink5Description: https://datasheet.ciiva.com/24068/aba0000ce2-40801-24068696.pdf?src-supplier=Mouser; ComponentLink6URL: https://datasheet.ciiva.com/14605/70255710-14605903.pdf?src-supplier=Allied+Electronics; ComponentLink6Description: https://datasheet.ciiva.com/14605/70255710-14605903.pdf?src-supplier=Allied+Electronics; ComponentLink7URL: https://datasheet.ciiva.com/14604/70255710-14604812.pdf?src-supplier=Allied+Electronics; ComponentLink7Description: https://datasheet.ciiva.com/14604/70255710-14604812.pdf?src-supplier=Allied+Electronics; ComponentLink8URL: https://datasheet.ciiva.com/2985/aba0000ce2-2985209.pdf?src-supplier=Avnet; ComponentLink8Description: https://datasheet.ciiva.com/2985/aba0000ce2-2985209.pdf?src-supplier=Avnet; ComponentLink9URL: https://datasheet.ciiva.com/30253/11aba0000ce2-30253045.pdf?src-supplier=Onlinecomponents.com; ComponentLink9Description: https://datasheet.ciiva.com/30253/11aba0000ce2-30253045.pdf?src-supplier=Onlinecomponents.com; ComponentLink10URL: https://datasheet.ciiva.com/15165/getdatasheetpartid-40969-15165709.pdf?src-supplier=Verical; ComponentLink10Description: https://datasheet.ciiva.com/15165/getdatasheetpartid-40969-15165709.pdf?src-supplier=Verical
footprint CAPACITOR/ALU - SIZE G/SMD - 10X10.2 (CAPACITOR  -  ALUMINIUM - SIZE G / EEEFK - SMD)
pins: 1, 2
text: +
